# Altium footprint library GBA.PcbLib: 115 footprints (part 6 of 8)
Each footprint in its own frame and in the unit in brackets; x right, y up, seen from the top. Pads: shape width x height; smd on the part's side, far side on the other; paste and mask are expansions set on the pad; w line width, h text height; cw(c..) or ccw(c..) is an arc to the next point about the centre after c.
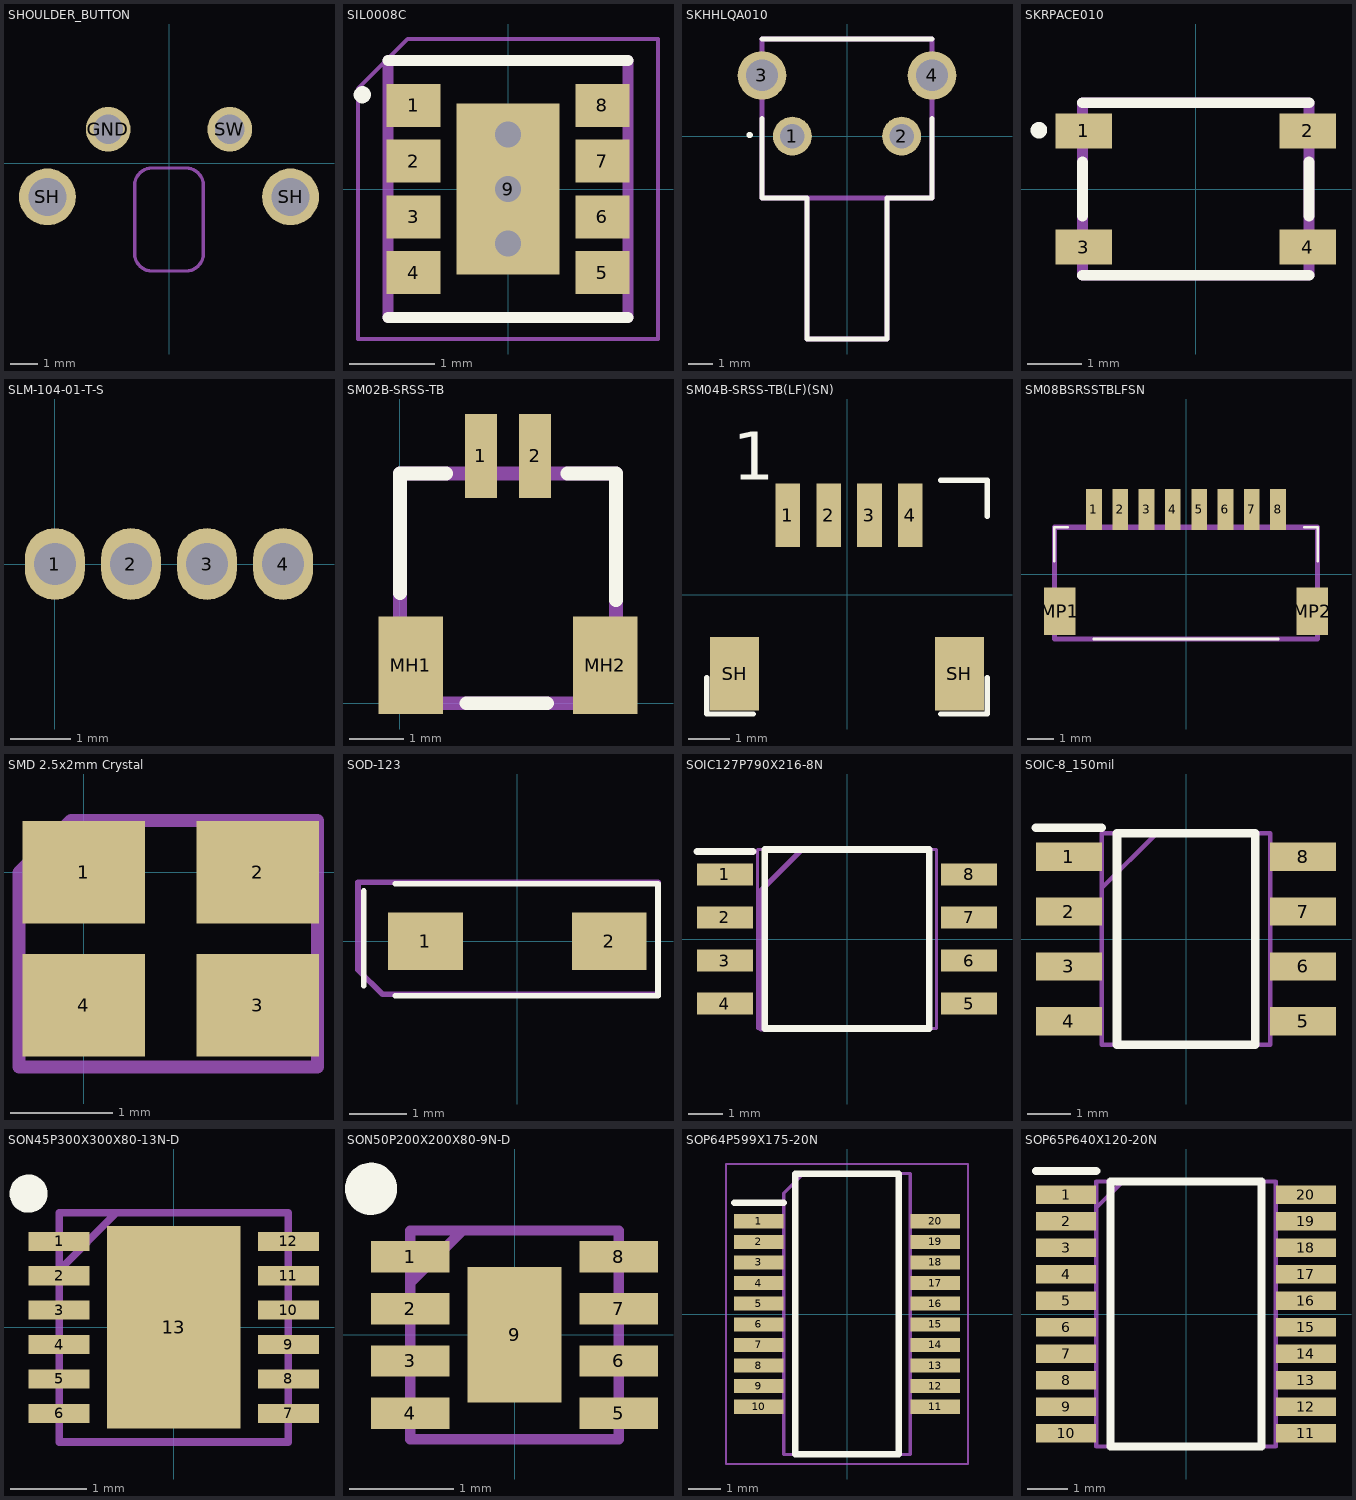
[diagram p5: the footprints below, top view; thin cyan lines are the x and y axes]

## SHOULDER_BUTTON [mm]
pads (4):
  round 1.65 hole 1.1: GND(-2.25,1.25) SW(2.25,1.25)
  round 2.1 hole 1.4: SH(-4.5,-1.25) SH(4.5,-1.25)
Dimensions:
  lines w0.127: -1.27,-3.358 ccw(c-0.635,-3.358) -0.635,-3.993 0.635,-3.993 ccw(c0.635,-3.358) 1.27,-3.358 1.27,-0.818 ccw(c0.635,-0.818) 0.635,-0.183 -0.635,-0.183 ccw(c-0.635,-0.818) -1.27,-0.818 -1.27,-3.358

## SIL0008C [mm]
pads (9):
  rect 0.63x0.5 smd: 1(-1.1,0.975) 2(-1.1,0.325) 3(-1.1,-0.325) 4(-1.1,-0.975) 5(1.1,-0.975) 6(1.1,-0.325) 7(1.1,0.325) 8(1.1,0.975)
  rect 1.2x2 smd: 9(0,0)
via 0,0 diameter 0.55 hole 0.3
via 0,-0.635 diameter 0.55 hole 0.3
via 0,0.635 diameter 0.55 hole 0.3
Top Overlay:
  circle w0.1: c-1.7,1.1 r0.05
  lines w0.127: -1.4,-1.5 1.4,-1.5 ; -1.4,1.5 1.4,1.5
Top Paste:
  region: -0.521,-0.1 0.52,-0.1 0.52,-0.953 -0.521,-0.953
  region: -0.521,0.95 0.52,0.95 0.52,0.1 -0.521,0.1
  region: 0.852,-0.775 1.35,-0.775 1.35,-1.177 0.852,-1.177
  region: 0.852,1.175 1.35,1.175 1.35,0.777 0.852,0.777
  region: 0.852,-0.125 1.35,-0.125 1.35,-0.526 0.852,-0.526
  region: 0.852,0.525 1.35,0.525 1.35,0.125 0.852,0.125
  region: -1.353,-0.775 -0.85,-0.775 -0.85,-1.177 -1.353,-1.177
  region: -1.353,1.175 -0.85,1.175 -0.85,0.777 -1.353,0.777
  region: -1.353,-0.125 -0.85,-0.125 -0.85,-0.526 -1.353,-0.526
  region: -1.352,0.525 -0.85,0.525 -0.85,0.125 -1.352,0.125
Top Solder:
  region: -0.551,0.95 0.55,0.95 0.55,-0.952 -0.551,-0.952
  region: 0.852,-0.775 1.35,-0.775 1.35,-1.177 0.852,-1.177
  region: 0.853,1.175 1.35,1.175 1.35,0.778 0.853,0.778
  region: 0.853,-0.125 1.35,-0.125 1.35,-0.527 0.853,-0.527
  region: 0.852,0.525 1.35,0.525 1.35,0.125 0.852,0.125
  region: -1.353,-0.775 -0.85,-0.775 -0.85,-1.178 -1.353,-1.178
  region: -1.352,1.175 -0.85,1.175 -0.85,0.776 -1.352,0.776
  region: -1.351,-0.125 -0.85,-0.125 -0.85,-0.525 -1.351,-0.525
  region: -1.353,0.525 -0.85,0.525 -0.85,0.125 -1.353,0.125
Bottom 3D Body (Mech4):
  lines w0.127: -1.4,-1.5 -1.4,1.5 1.4,1.5 1.4,-1.5 -1.4,-1.5
Top Designator (Mech29):
  lines w0.05: -1.75,-1.75 -1.75,1.171 -1.171,1.75 1.75,1.75 1.75,-1.75 -1.75,-1.75
  text ".Designator" at -1.143,-0.381 h0.8
3D body "TPS82084SILT.step": height 1.33, standoff 0, extent -1.4,-1.476 1.4,1.524

## SKHHLQA010 [mm]
pads (4):
  round 1.6 hole 1: 1(-2.25,0) 2(2.25,0)
  round 2 hole 1.3: 3(-3.5,2.5) 4(3.5,2.5)
Top Overlay:
  circle w0.2: c-4.01,0.048 r0.031
  lines w0.2: -3.5,0.725 -3.5,-2.55 -1.65,-2.55 -1.65,-8.35 1.65,-8.35 1.65,-2.55 3.5,-2.55 3.5,0.725 ; -3.5,4 3.5,4
Mechanical 13:
  lines w0.2: -1.65,-2.55 -1.65,-8.35 1.65,-8.35 1.65,-2.55 ; -3.5,-2.55 3.5,-2.55 3.5,4 -3.5,4 -3.5,-2.55
Top Designator (Mech29):
  text ".Designator" at -1.905,0 h1
3D body "SKHHLQA010.stp": height 7.5, standoff -3.4, extent -4.25,-8.387 4.25,4.013

## SKRPACE010 [mm]
pads (4):
  rect 1.05x0.65 smd: 1(-2.075,1.075) 2(2.075,1.075) 3(-2.075,-1.075) 4(2.075,-1.075)
Top Overlay:
  circle w0.2: c-2.906,1.089 r0.053
  lines w0.2: -2.1,-1.6 2.1,-1.6 ; -2.1,-0.5 -2.1,0.5 ; -2.1,1.6 2.1,1.6 ; 2.1,-0.5 2.1,0.5
Mechanical 13:
  lines w0.2: -2.1,-1.6 2.1,-1.6 2.1,1.6 -2.1,1.6 -2.1,-1.6
Top Designator (Mech29):
  text ".Designator" at -1.651,-0.193 h1
3D body "SKRPACE010.stp": height 2.5, standoff 0, extent -2.3,-1.6 2.3,1.6

## SLM-104-01-T-S [mm]
pads (4):
  oval 1x1.2 hole 0.7: 1(0,0) 2(1.27,0) 3(2.54,0) 4(3.81,0)
Top Designator (Mech29):
  text ".Designator" at -0.127,-0.254 h1
3D body "SLM-104-01-G-S.stp": height 4.57, standoff -2.92, extent -0.749,-1.27 4.559,1.27

## SM02B-SRSS-TB [mm]
pads (4):
  rect 0.6x1.55 smd: 1(1.5,4.575) 2(2.5,4.575)
  rect 1.2x1.8 smd: MH1(0.2,0.7) MH2(3.8,0.7)
Top Overlay:
  lines w0.254: 0,2.037 0,4.25 0.855,4.25 ; 1.233,0 2.722,0 ; 3.1,4.25 4,4.25 4,1.903
Mechanical 13:
  lines w0.254: 0,0 4,0 4,4.25 0,4.25 0,0
Top Designator (Mech29):
  text ".Designator" at 0,2.475 h1
3D body "JST_SM02B-SRSS-TB.step": height 3, standoff 0, extent 0.038,0 4.026,4.987

## SM04B-SRSS-TB(LF)(SN) [mm]
pads (6):
  rect 0.6x1.55 smd: 1(-1.45,1.938) 2(-0.45,1.938) 3(0.55,1.938) 4(1.55,1.938)
  rect 1.2x1.8 smd: SH(-2.75,-1.937) SH(2.75,-1.937)
Top Overlay:
  lines w0.127: -3.429,-2.032 -3.429,-2.921 -2.286,-2.921 ; 2.286,-2.921 3.429,-2.921 3.429,-2.032 ; 2.286,2.794 3.429,2.794 3.429,1.905
  text "1" at -2.794,2.413 h2
3D body "SM04B-SRSS-TB(LF)(SN)--3DModel-STEP-56544.STEP": height 2.96, standoff 0, extent -3,-2.794 3,2.156

## SM08BSRSSTBLFSN [mm]
pads (10):
  rect 0.6x1.55 smd: 1(-3.5,2.463) 2(-2.5,2.463) 3(-1.5,2.463) 4(-0.5,2.463) 5(0.5,2.463) 6(1.5,2.463) 7(2.5,2.463) 8(3.5,2.463)
  rect 1.2x1.8 smd: MP1(-4.8,-1.413) MP2(4.8,-1.413)
Top Overlay:
  lines w0.1: -5,0.5 -5,1.787 -4.5,1.787 ; -3.5,-2.463 3.5,-2.463 ; 4.5,1.787 5,1.787 5,0.5
Mechanical 13:
  lines w0.2: -5,-2.463 -5,1.787 5,1.787 5,-2.463 -5,-2.463
Top Designator (Mech29):
  text ".Designator" at -2.286,-1.27 h1
3D body "SM08B-SRSS-TB(LF)(SN)--3DModel-STEP-56544.STEP": height 3, standoff 0.05, extent -5,-2.032 5,2.918

## SMD 2.5x2mm Crystal [mm]
pads (4):
  rect 1.2x1 smd: 1(0,0) 2(1.7,0) 3(1.7,-1.3) 4(0,-1.3)
Top Designator:
  lines w0.127: -0.635,-1.905 2.286,-1.905 2.286,0.508 -0.127,0.508 -0.635,0 -0.635,-1.905
  text ".Designator" at -0.508,-1.016 h1
3D body "User Library-SM2520-4.step": height 0.8, standoff -0.03, extent -0.361,-1.635 2.139,0.365

## SOD-123 [mm]
pads (2):
  rect 1.3x1 smd: 1(-1.6,0) 2(1.6,0)
Top Overlay:
  lines w0.1: -2.675,-0.775 -2.675,0.875 ; -2.125,-0.95 2.45,-0.95 2.45,1 -2.125,1
Top Designator (Mech29):
  lines w0.1: -2.775,-0.5 -2.775,1.025 2.45,1.025 2.45,-0.925 -2.35,-0.925 -2.775,-0.5
  text ".Designator" at -1.8,-0.35 h1
3D body "SOD-123FL.STEP": height 0.95, standoff 0, extent -1.825,-0.825 1.775,0.825

## SOIC127P790X216-8N [mm]
pads (8):
  rect 1.65x0.65 smd: 1(-3.6,1.905) 2(-3.6,0.635) 3(-3.6,-0.635) 4(-3.6,-1.905) 5(3.6,-1.905) 6(3.6,-0.635) 7(3.6,0.635) 8(3.6,1.905)
Top Overlay:
  lines w0.2: -4.425,2.58 -2.775,2.58 ; -2.425,-2.64 -2.425,2.64 2.425,2.64 2.425,-2.64 -2.425,-2.64
Top Designator:
  lines w0.127: -2.54,-2.667 -2.54,1.397 -1.27,2.667 2.413,2.667 2.413,-2.667 -2.54,-2.667
  text ".Designator" at -1.905,-0.574 h1
Mechanical 13:
  lines w0.1: -2.64,1.37 -1.37,2.64 ; -2.64,-2.64 -2.64,2.64 2.64,2.64 2.64,-2.64 -2.64,-2.64
3D body "W25Q16JVSSIQ.stp": height 2.16, standoff 0, extent -3.95,-2.64 3.95,2.64

## SOIC-8_150mil [mm]
pads (8):
  rect 1.525x0.65 smd: 1(-2.712,1.905) 2(-2.712,0.635) 3(-2.712,-0.635) 4(-2.712,-1.905) 5(2.712,-1.905) 6(2.712,-0.635) 7(2.712,0.635) 8(2.712,1.905)
Top Overlay:
  lines w0.2: -3.475,2.58 -1.95,2.58 ; -1.6,-2.45 -1.6,2.45 1.6,2.45 1.6,-2.45 -1.6,-2.45
Top Designator (Mech29):
  lines w0.1: -1.95,1.18 -0.68,2.45 ; -1.95,-2.45 1.95,-2.45 1.95,2.45 -1.95,2.45 -1.95,-2.45
  text ".Designator" at 48.78,-36.605 h1
3D body "NE555DR.stp": height 1.75, standoff 0, extent -3,-2.45 3,2.45

## SON45P300X300X80-13N-D [mm]
pads (13):
  rect 0.8x0.25 smd: 1(-1.5,1.125) 2(-1.5,0.675) 3(-1.5,0.225) 4(-1.5,-0.225) 5(-1.5,-0.675) 6(-1.5,-1.125) 7(1.5,-1.125) 8(1.5,-0.675) 9(1.5,-0.225) 10(1.5,0.225) 11(1.5,0.675) 12(1.5,1.125)
  rect 1.75x2.65 smd: 13(0,0)
Top Overlay:
  circle w0.25: c-1.9,1.75 r0.125
Top Designator (Mech29):
  lines w0.1: -1.5,0.75 -0.75,1.5 ; -1.5,-1.5 -1.5,1.5 1.5,1.5 1.5,-1.5 -1.5,-1.5
  text ".Designator" at -1.143,-0.635 h1
3D body "RT8020AGQW.stp": height 0.8, standoff 0, extent -1.55,-1.5 1.55,1.5

## SON50P200X200X80-9N-D [mm]
pads (9):
  rect 0.75x0.3 smd: 1(-1,0.75) 2(-1,0.25) 3(-1,-0.25) 4(-1,-0.75) 5(1,-0.75) 6(1,-0.25) 7(1,0.25) 8(1,0.75)
  rect 0.9x1.3 smd: 9(0,0)
Top Overlay:
  circle w0.25: c-1.375,1.4 r0.125
Top Designator:
  lines w0.1: -1,0.5 -0.5,1 ; -1,-1 -1,1 1,1 1,-1 -1,-1
  text ".Designator" at -0.889,-0.635 h1
3D body "MAX98300ETA+T.stp": height 0.8, standoff 0, extent -1.05,-1 1.05,1

## SOP64P599X175-20N [mm]
pads (20):
  rect 1.526x0.435 smd: 1(-2.712,2.858) 2(-2.712,2.222) 3(-2.712,1.588) 4(-2.712,0.952) 5(-2.712,0.318) 6(-2.712,-0.318) 7(-2.712,-0.952) 8(-2.712,-1.588) 9(-2.712,-2.222) 10(-2.712,-2.858) 11(2.712,-2.858) 12(2.712,-2.222) 13(2.712,-1.588) 14(2.712,-0.952) 15(2.712,-0.318) 16(2.712,0.318) 17(2.712,0.952) 18(2.712,1.588) 19(2.712,2.222) 20(2.712,2.858)
Top Overlay:
  lines w0.2: -3.475,3.425 -1.95,3.425 ; -1.6,-4.324 1.6,-4.324 1.6,4.324 -1.6,4.324 -1.6,-4.324
Mechanical 20:
  lines w0.05: -3.725,-4.619 3.725,-4.619 3.725,4.619 -3.725,4.619 -3.725,-4.619
Top Designator (Mech29):
  lines w0.1: -1.95,-4.324 -1.95,3.72 -1.346,4.324 1.95,4.324 1.95,-4.324 -1.95,-4.324
  text ".Designator" at 0.254,-3.429 h0.8
3D body "FT231XS-R.stp": height 1.75, standoff 0, extent -2.997,-4.324 2.997,4.325

## SOP65P640X120-20N [mm]
pads (20):
  rect 1.475x0.45 smd: 1(-2.938,2.925) 2(-2.938,2.275) 3(-2.938,1.625) 4(-2.938,0.975) 5(-2.938,0.325) 6(-2.938,-0.325) 7(-2.938,-0.975) 8(-2.938,-1.625) 9(-2.938,-2.275) 10(-2.938,-2.925) 11(2.938,-2.925) 12(2.938,-2.275) 13(2.938,-1.625) 14(2.938,-0.975) 15(2.938,-0.325) 16(2.938,0.325) 17(2.938,0.975) 18(2.938,1.625) 19(2.938,2.275) 20(2.938,2.925)
Top Overlay:
  lines w0.2: -3.675,3.5 -2.2,3.5 ; -1.85,-3.25 -1.85,3.25 1.85,3.25 1.85,-3.25 -1.85,-3.25
Top Designator (Mech29):
  lines w0.1: -2.2,2.6 -1.55,3.25 ; -2.2,-3.25 2.2,-3.25 2.2,3.25 -2.2,3.25 -2.2,-3.25
  text ".Designator" at -1.905,-0.381 h1
3D body "PCM5102APWR.stp": height 1.2, standoff 0, extent -3.2,-3.25 3.2,3.25